# Altium footprint library 2.10-LQFP封装.PcbLib: 109 footprints (part 5 of 8)
Each footprint in its own frame and in the unit in brackets; x right, y up, seen from the top. Pads: shape width x height; smd on the part's side, far side on the other; paste and mask are expansions set on the pad; w line width, h text height; cw(c..) or ccw(c..) is an arc to the next point about the centre after c.
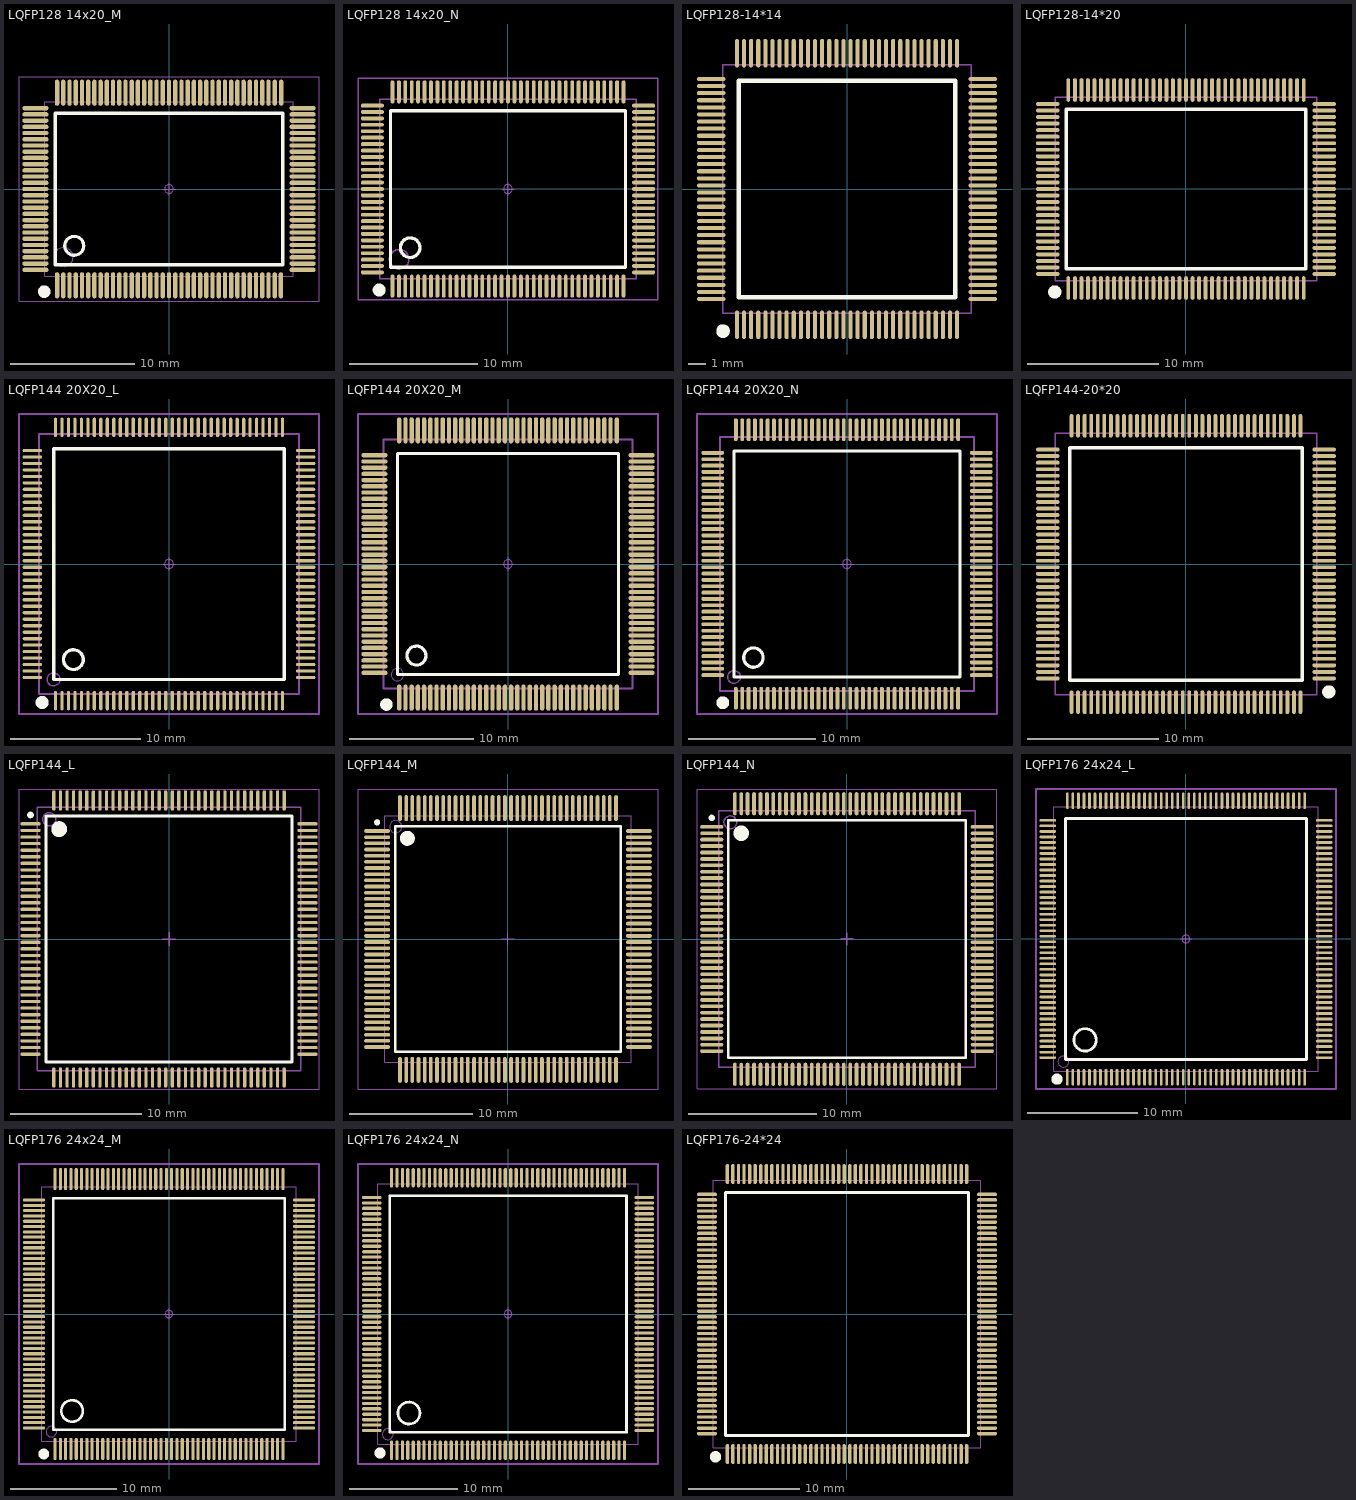
[diagram p4: the footprints below, top view; thin cyan lines are the x and y axes]

## LQFP128 14x20_M [mm] "128脚，体宽：14x20mm, 脚距：0.5mm      [ PCB学习群514746572 ]"
pads (128):
  oval 0.35x2.1 smd: 1(-9,-7.746) 2(-8.5,-7.746) 3(-8,-7.746) 4(-7.5,-7.746) 5(-7,-7.746) 6(-6.5,-7.746) 7(-6,-7.746) 8(-5.5,-7.746) 9(-5,-7.746) 10(-4.5,-7.746) 11(-4,-7.746) 12(-3.5,-7.746) 13(-3,-7.746) 14(-2.5,-7.746) 15(-2,-7.746) 16(-1.5,-7.746) 17(-1,-7.746) 18(-0.5,-7.746) 19(0,-7.746) 20(0.5,-7.746) 21(1,-7.746) 22(1.5,-7.746) 23(2,-7.746) 24(2.5,-7.746) 25(3,-7.746) 26(3.5,-7.746) 27(4,-7.746) 28(4.5,-7.746) 29(5,-7.746) 30(5.5,-7.746) 31(6,-7.746) 32(6.5,-7.746) 33(7,-7.746) 34(7.5,-7.746) 35(8,-7.746) 36(8.5,-7.746) 37(9,-7.746) 65(9.025,7.746) 66(8.5,7.746) 67(8,7.746) 68(7.5,7.746) 69(7,7.746) 70(6.5,7.746) 71(6,7.746) 72(5.5,7.746) 73(5,7.746) 74(4.5,7.746) 75(4,7.746) 76(3.5,7.746) 77(3,7.746) 78(2.5,7.746) 79(2,7.746) 80(1.5,7.746) 81(1,7.746) 82(0.5,7.746) 83(0,7.746) 84(-0.5,7.746) 85(-1,7.746) 86(-1.5,7.746) 87(-2,7.746) 88(-2.5,7.746) 89(-3,7.746) 90(-3.5,7.746) 91(-4,7.746) 92(-4.5,7.746) 93(-5,7.746) 94(-5.5,7.746) 95(-6,7.746) 96(-6.5,7.746) 97(-7,7.746) 98(-7.5,7.746) 99(-8,7.746) 100(-8.5,7.746) 101(-9,7.746)
  oval 2.1x0.35 smd: 38(10.746,-6.5) 39(10.746,-6) 40(10.746,-5.5) 41(10.746,-5) 42(10.746,-4.5) 43(10.746,-4) 44(10.746,-3.5) 45(10.746,-3) 46(10.746,-2.5) 47(10.746,-2) 48(10.746,-1.5) 49(10.746,-1) 50(10.746,-0.5) 51(10.746,0) 52(10.746,0.5) 53(10.746,1) 54(10.746,1.5) 55(10.746,2) 56(10.746,2.5) 57(10.746,3) 58(10.746,3.5) 59(10.746,4) 60(10.746,4.5) 61(10.746,5) 62(10.746,5.5) 63(10.746,6) 64(10.746,6.5) 102(-10.746,6.5) 103(-10.746,6) 104(-10.746,5.5) 105(-10.746,5) 106(-10.746,4.5) 107(-10.746,4) 108(-10.746,3.5) 109(-10.746,3) 110(-10.746,2.5) 111(-10.746,2) 112(-10.746,1.5) 113(-10.746,1) 114(-10.746,0.5) 115(-10.746,0) 116(-10.746,-0.5) 117(-10.746,-1) 118(-10.746,-1.5) 119(-10.746,-2) 120(-10.746,-2.5) 121(-10.746,-3) 122(-10.746,-3.5) 123(-10.746,-4) 124(-10.746,-4.5) 125(-10.746,-5) 126(-10.746,-5.5) 127(-10.746,-6) 128(-10.746,-6.5)
Top Overlay:
  circle w0.508: c-10.033,-8.255 r0.25
  circle w0.254: c-7.62,-4.572 r0.762
  lines w0.254: -9.144,-6.096 9.144,-6.096 9.144,6.096 -9.144,6.096 -9.144,-6.096
Mechanical 13:
  circle w0.1: c-8.476,-5.476 r0.762
  lines w0.1: -10,-7 -10,7 10,7 10,-7 -10,-7
Mechanical 15:
  circle w0.05: c0,0 r0.35
  lines w0.05: -0.5,0 0.5,0 ; 0,-0.5 0,0.5
  lines w0.1: -12.065,-9.017 12.065,-9.017 12.065,9.017 -12.065,9.017 -12.065,-9.017
3D body "LQFP128-14x20.STEP": height 1.45, standoff 0, extent -11.003,-8.003 11.003,8.003

## LQFP128 14x20_N [mm] "128脚，体宽：14x20mm, 脚距：0.5mm     [ PCB学习群514746572 ]"
pads (128):
  oval 0.3x1.8 smd: 1(-8.998,-7.571) 2(-8.498,-7.571) 3(-7.998,-7.571) 4(-7.498,-7.571) 5(-6.998,-7.571) 6(-6.498,-7.571) 7(-5.998,-7.571) 8(-5.498,-7.571) 9(-4.998,-7.571) 10(-4.498,-7.571) 11(-3.998,-7.571) 12(-3.498,-7.571) 13(-2.998,-7.571) 14(-2.498,-7.571) 15(-1.998,-7.571) 16(-1.498,-7.571) 17(-0.998,-7.571) 18(-0.498,-7.571) 19(0.002,-7.571) 20(0.502,-7.571) 21(1.002,-7.571) 22(1.502,-7.571) 23(2.002,-7.571) 24(2.502,-7.571) 25(3.002,-7.571) 26(3.502,-7.571) 27(4.002,-7.571) 28(4.502,-7.571) 29(5.002,-7.571) 30(5.502,-7.571) 31(6.002,-7.571) 32(6.502,-7.571) 33(7.002,-7.571) 34(7.502,-7.571) 35(8.002,-7.571) 36(8.502,-7.571) 37(9.002,-7.571) 65(9.002,7.566) 66(8.502,7.566) 67(8.002,7.566) 68(7.502,7.566) 69(7.002,7.566) 70(6.502,7.566) 71(6.002,7.566) 72(5.502,7.566) 73(5.002,7.566) 74(4.502,7.566) 75(4.002,7.566) 76(3.502,7.566) 77(3.002,7.566) 78(2.502,7.566) 79(2.002,7.566) 80(1.502,7.566) 81(1.002,7.566) 82(0.502,7.566) 83(0.002,7.566) 84(-0.498,7.566) 85(-0.998,7.566) 86(-1.498,7.566) 87(-1.998,7.566) 88(-2.498,7.566) 89(-2.998,7.566) 90(-3.498,7.566) 91(-3.998,7.566) 92(-4.498,7.566) 93(-4.998,7.566) 94(-5.498,7.566) 95(-5.998,7.566) 96(-6.498,7.566) 97(-6.998,7.566) 98(-7.498,7.566) 99(-7.998,7.566) 100(-8.498,7.566) 101(-8.998,7.566)
  oval 1.8x0.3 smd: 38(10.57,-6.502) 39(10.57,-6.002) 40(10.57,-5.502) 41(10.57,-5.002) 42(10.57,-4.502) 43(10.57,-4.002) 44(10.57,-3.502) 45(10.57,-3.002) 46(10.57,-2.502) 47(10.57,-2.002) 48(10.57,-1.502) 49(10.57,-1.002) 50(10.57,-0.502) 51(10.57,-0.002) 52(10.57,0.498) 53(10.57,0.998) 54(10.57,1.498) 55(10.57,1.998) 56(10.57,2.498) 57(10.57,2.998) 58(10.57,3.498) 59(10.57,3.998) 60(10.57,4.498) 61(10.57,4.998) 62(10.57,5.498) 63(10.57,5.998) 64(10.57,6.498) 102(-10.566,6.498) 103(-10.566,5.998) 104(-10.566,5.498) 105(-10.566,4.998) 106(-10.566,4.498) 107(-10.566,3.998) 108(-10.566,3.498) 109(-10.566,2.998) 110(-10.566,2.498) 111(-10.566,1.998) 112(-10.566,1.498) 113(-10.566,0.998) 114(-10.566,0.498) 115(-10.566,-0.002) 116(-10.566,-0.502) 117(-10.566,-1.002) 118(-10.566,-1.502) 119(-10.566,-2.002) 120(-10.566,-2.502) 121(-10.566,-3.002) 122(-10.566,-3.502) 123(-10.566,-4.002) 124(-10.566,-4.502) 125(-10.566,-5.002) 126(-10.566,-5.502) 127(-10.566,-6.002) 128(-10.566,-6.502)
Top Overlay:
  circle w0.508: c-10.033,-7.874 r0.25
  circle w0.254: c-7.618,-4.574 r0.762
  lines w0.254: -9.142,-6.098 9.146,-6.098 9.146,6.094 -9.142,6.094 -9.142,-6.098
Mechanical 13:
  circle w0.1: c-8.474,-5.478 r0.762
  lines w0.1: -9.998,-7.002 -9.998,6.998 10.002,6.998 10.002,-7.002 -9.998,-7.002
Mechanical 15:
  circle w0.05: c0.002,-0.002 r0.35
  lines w0.05: -0.498,-0.002 0.502,-0.002 ; 0.002,-0.502 0.002,0.498
  lines w0.1: -11.682,-8.638 11.686,-8.638 11.686,8.634 -11.682,8.634 -11.682,-8.638
3D body "LQFP128-14x20.STEP": height 1.45, standoff 0, extent -11.003,-8.003 11.003,8.003

## LQFP128-14*14 [mm] "14x14mm, 0.4mm      [ PCBѧϰȺ514746572 ]"
pads (128):
  oval 0.23x1.6 smd: 1(-6.2,-7.648) 2(-5.8,-7.648) 3(-5.4,-7.648) 4(-5,-7.648) 5(-4.6,-7.648) 6(-4.2,-7.648) 7(-3.8,-7.648) 8(-3.4,-7.648) 9(-3,-7.648) 10(-2.6,-7.648) 11(-2.2,-7.648) 12(-1.8,-7.648) 13(-1.4,-7.648) 14(-1,-7.648) 15(-0.6,-7.648) 16(-0.2,-7.648) 17(0.2,-7.648) 18(0.6,-7.648) 19(1,-7.648) 20(1.4,-7.648) 21(1.8,-7.648) 22(2.2,-7.648) 23(2.6,-7.648) 24(3,-7.648) 25(3.4,-7.648) 26(3.8,-7.648) 27(4.2,-7.648) 28(4.6,-7.648) 29(5,-7.648) 30(5.4,-7.648) 31(5.8,-7.648) 32(6.2,-7.648) 65(6.2,7.653) 66(5.8,7.653) 67(5.4,7.653) 68(5,7.653) 69(4.6,7.653) 70(4.2,7.653) 71(3.8,7.653) 72(3.4,7.653) 73(3,7.653) 74(2.6,7.653) 75(2.2,7.653) 76(1.8,7.653) 77(1.4,7.653) 78(1,7.653) 79(0.6,7.653) 80(0.2,7.653) 81(-0.2,7.653) 82(-0.6,7.653) 83(-1,7.653) 84(-1.4,7.653) 85(-1.8,7.653) 86(-2.2,7.653) 87(-2.6,7.653) 88(-3,7.653) 89(-3.4,7.653) 90(-3.8,7.653) 91(-4.2,7.653) 92(-4.6,7.653) 93(-5,7.653) 94(-5.4,7.653) 95(-5.8,7.653) 96(-6.2,7.653)
  oval 1.6x0.23 smd: 33(7.651,-6.198) 34(7.651,-5.798) 35(7.651,-5.398) 36(7.651,-4.998) 37(7.651,-4.598) 38(7.651,-4.198) 39(7.651,-3.798) 40(7.651,-3.398) 41(7.651,-2.998) 42(7.651,-2.598) 43(7.651,-2.198) 44(7.651,-1.798) 45(7.651,-1.398) 46(7.651,-0.998) 47(7.651,-0.598) 48(7.651,-0.198) 49(7.651,0.202) 50(7.651,0.602) 51(7.651,1.002) 52(7.651,1.402) 53(7.651,1.802) 54(7.651,2.202) 55(7.651,2.602) 56(7.651,3.002) 57(7.651,3.402) 58(7.651,3.802) 59(7.651,4.202) 60(7.651,4.602) 61(7.651,5.002) 62(7.651,5.402) 63(7.651,5.802) 64(7.651,6.202) 97(-7.651,6.202) 98(-7.651,5.802) 99(-7.651,5.402) 100(-7.651,5.002) 101(-7.651,4.602) 102(-7.651,4.202) 103(-7.651,3.802) 104(-7.651,3.402) 105(-7.651,3.002) 106(-7.651,2.602) 107(-7.651,2.202) 108(-7.651,1.802) 109(-7.651,1.402) 110(-7.651,1.002) 111(-7.651,0.602) 112(-7.651,0.202) 113(-7.651,-0.198) 114(-7.651,-0.598) 115(-7.651,-0.998) 116(-7.651,-1.398) 117(-7.651,-1.798) 118(-7.651,-2.198) 119(-7.651,-2.598) 120(-7.651,-2.998) 121(-7.651,-3.398) 122(-7.651,-3.798) 123(-7.651,-4.198) 124(-7.651,-4.598) 125(-7.651,-4.998) 126(-7.651,-5.398) 127(-7.651,-5.798) 128(-7.651,-6.198)
Top Overlay:
  circle w0.508: c-6.985,-8.001 r0.127
  lines w0.254: -6.096,-6.094 6.096,-6.094 6.096,6.098 -6.096,6.098 -6.096,-6.094
Mechanical 13:
  lines w0.1: -7,-6.998 -7,7.002 7,7.002 7,-6.998 -7,-6.998
3D body "LQFP128-14x14.STEP": height 1.45, standoff 0, extent -8.003,-8.003 8.003,8.003

## LQFP128-14*20 [mm] "14x20mm, 0.5mm      [ PCBѧϰȺ514746572 ]"
pads (128):
  oval 0.3x1.8 smd: 1(-8.998,-7.571) 2(-8.498,-7.571) 3(-7.998,-7.571) 4(-7.498,-7.571) 5(-6.998,-7.571) 6(-6.498,-7.571) 7(-5.998,-7.571) 8(-5.498,-7.571) 9(-4.998,-7.571) 10(-4.498,-7.571) 11(-3.998,-7.571) 12(-3.498,-7.571) 13(-2.998,-7.571) 14(-2.498,-7.571) 15(-1.998,-7.571) 16(-1.498,-7.571) 17(-0.998,-7.571) 18(-0.498,-7.571) 19(0.002,-7.571) 20(0.502,-7.571) 21(1.002,-7.571) 22(1.502,-7.571) 23(2.002,-7.571) 24(2.502,-7.571) 25(3.002,-7.571) 26(3.502,-7.571) 27(4.002,-7.571) 28(4.502,-7.571) 29(5.002,-7.571) 30(5.502,-7.571) 31(6.002,-7.571) 32(6.502,-7.571) 33(7.002,-7.571) 34(7.502,-7.571) 35(8.002,-7.571) 36(8.502,-7.571) 37(9.002,-7.571) 65(9.002,7.566) 66(8.502,7.566) 67(8.002,7.566) 68(7.502,7.566) 69(7.002,7.566) 70(6.502,7.566) 71(6.002,7.566) 72(5.502,7.566) 73(5.002,7.566) 74(4.502,7.566) 75(4.002,7.566) 76(3.502,7.566) 77(3.002,7.566) 78(2.502,7.566) 79(2.002,7.566) 80(1.502,7.566) 81(1.002,7.566) 82(0.502,7.566) 83(0.002,7.566) 84(-0.498,7.566) 85(-0.998,7.566) 86(-1.498,7.566) 87(-1.998,7.566) 88(-2.498,7.566) 89(-2.998,7.566) 90(-3.498,7.566) 91(-3.998,7.566) 92(-4.498,7.566) 93(-4.998,7.566) 94(-5.498,7.566) 95(-5.998,7.566) 96(-6.498,7.566) 97(-6.998,7.566) 98(-7.498,7.566) 99(-7.998,7.566) 100(-8.498,7.566) 101(-8.998,7.566)
  oval 1.8x0.3 smd: 38(10.57,-6.502) 39(10.57,-6.002) 40(10.57,-5.502) 41(10.57,-5.002) 42(10.57,-4.502) 43(10.57,-4.002) 44(10.57,-3.502) 45(10.57,-3.002) 46(10.57,-2.502) 47(10.57,-2.002) 48(10.57,-1.502) 49(10.57,-1.002) 50(10.57,-0.502) 51(10.57,-0.002) 52(10.57,0.498) 53(10.57,0.998) 54(10.57,1.498) 55(10.57,1.998) 56(10.57,2.498) 57(10.57,2.998) 58(10.57,3.498) 59(10.57,3.998) 60(10.57,4.498) 61(10.57,4.998) 62(10.57,5.498) 63(10.57,5.998) 64(10.57,6.498) 102(-10.566,6.498) 103(-10.566,5.998) 104(-10.566,5.498) 105(-10.566,4.998) 106(-10.566,4.498) 107(-10.566,3.998) 108(-10.566,3.498) 109(-10.566,2.998) 110(-10.566,2.498) 111(-10.566,1.998) 112(-10.566,1.498) 113(-10.566,0.998) 114(-10.566,0.498) 115(-10.566,-0.002) 116(-10.566,-0.502) 117(-10.566,-1.002) 118(-10.566,-1.502) 119(-10.566,-2.002) 120(-10.566,-2.502) 121(-10.566,-3.002) 122(-10.566,-3.502) 123(-10.566,-4.002) 124(-10.566,-4.502) 125(-10.566,-5.002) 126(-10.566,-5.502) 127(-10.566,-6.002) 128(-10.566,-6.502)
Top Overlay:
  circle w0.508: c-10.033,-7.874 r0.25
  lines w0.254: -9.142,-6.098 -9.142,6.094 9.146,6.094 9.146,-6.098 -9.142,-6.098
Mechanical 13:
  lines w0.1: -9.998,-7.002 10.002,-7.002 10.002,6.998 -9.998,6.998 -9.998,-7.002
3D body "LQFP128-14x20.STEP": height 1.45, standoff 0, extent -11.003,-8.003 11.003,8.003

## LQFP144 20X20_L [mm] "144脚，体宽20x20mm，脚距0.5mm      [ PCB学习群514746572 ]"
pads (144):
  oval 0.25x1.5 smd: 1(-8.75,-10.525) 2(-8.25,-10.525) 3(-7.75,-10.525) 4(-7.25,-10.525) 5(-6.75,-10.525) 6(-6.25,-10.525) 7(-5.75,-10.525) 8(-5.25,-10.525) 9(-4.75,-10.525) 10(-4.25,-10.525) 11(-3.75,-10.525) 12(-3.25,-10.525) 13(-2.75,-10.525) 14(-2.25,-10.525) 15(-1.75,-10.525) 16(-1.25,-10.525) 17(-0.75,-10.525) 18(-0.25,-10.525) 19(0.25,-10.525) 20(0.75,-10.525) 21(1.25,-10.525) 22(1.75,-10.525) 23(2.25,-10.525) 24(2.75,-10.525) 25(3.25,-10.525) 26(3.75,-10.525) 27(4.25,-10.525) 28(4.75,-10.525) 29(5.25,-10.525) 30(5.75,-10.525) 31(6.25,-10.525) 32(6.75,-10.525) 33(7.25,-10.525) 34(7.75,-10.525) 35(8.25,-10.525) 36(8.75,-10.525) 73(8.75,10.525) 74(8.25,10.525) 75(7.75,10.525) 76(7.25,10.525) 77(6.75,10.525) 78(6.25,10.525) 79(5.75,10.525) 80(5.25,10.525) 81(4.75,10.525) 82(4.25,10.525) 83(3.75,10.525) 84(3.25,10.525) 85(2.75,10.525) 86(2.25,10.525) 87(1.75,10.525) 88(1.25,10.525) 89(0.75,10.525) 90(0.25,10.525) 91(-0.25,10.525) 92(-0.75,10.525) 93(-1.25,10.525) 94(-1.75,10.525) 95(-2.25,10.525) 96(-2.75,10.525) 97(-3.25,10.525) 98(-3.75,10.525) 99(-4.25,10.525) 100(-4.75,10.525) 101(-5.25,10.525) 102(-5.75,10.525) 103(-6.25,10.525) 104(-6.75,10.525) 105(-7.25,10.525) 106(-7.75,10.525) 107(-8.25,10.525) 108(-8.75,10.525)
  oval 1.5x0.25 smd: 37(10.525,-8.75) 38(10.525,-8.25) 39(10.525,-7.75) 40(10.525,-7.25) 41(10.525,-6.75) 42(10.525,-6.25) 43(10.525,-5.75) 44(10.525,-5.25) 45(10.525,-4.75) 46(10.525,-4.25) 47(10.525,-3.75) 48(10.525,-3.25) 49(10.525,-2.75) 50(10.525,-2.25) 51(10.525,-1.75) 52(10.525,-1.25) 53(10.525,-0.75) 54(10.525,-0.25) 55(10.525,0.25) 56(10.525,0.75) 57(10.525,1.25) 58(10.525,1.75) 59(10.525,2.25) 60(10.525,2.75) 61(10.525,3.25) 62(10.525,3.75) 63(10.525,4.25) 64(10.525,4.75) 65(10.525,5.25) 66(10.525,5.75) 67(10.525,6.25) 68(10.525,6.75) 69(10.525,7.25) 70(10.525,7.75) 71(10.525,8.25) 72(10.525,8.75) 109(-10.525,8.75) 110(-10.525,8.25) 111(-10.525,7.75) 112(-10.525,7.25) 113(-10.525,6.75) 114(-10.525,6.25) 115(-10.525,5.75) 116(-10.525,5.25) 117(-10.525,4.75) 118(-10.525,4.25) 119(-10.525,3.75) 120(-10.525,3.25) 121(-10.525,2.75) 122(-10.525,2.25) 123(-10.525,1.75) 124(-10.525,1.25) 125(-10.525,0.75) 126(-10.525,0.25) 127(-10.525,-0.25) 128(-10.525,-0.75) 129(-10.525,-1.25) 130(-10.525,-1.75) 131(-10.525,-2.25) 132(-10.525,-2.75) 133(-10.525,-3.25) 134(-10.525,-3.75) 135(-10.525,-4.25) 136(-10.525,-4.75) 137(-10.525,-5.25) 138(-10.525,-5.75) 139(-10.525,-6.25) 140(-10.525,-6.75) 141(-10.525,-7.25) 142(-10.525,-7.75) 143(-10.525,-8.25) 144(-10.525,-8.75)
Top Overlay:
  circle w0.508: c-9.779,-10.668 r0.25
  circle w0.254: c-7.366,-7.366 r0.762
  lines w0.254: -8.89,-8.892 -8.89,8.89 8.89,8.89 8.89,-8.892 -8.89,-8.892
Mechanical 13:
  circle w0.1: c-8.894,-8.894 r0.5
  lines w0.15: -10,-10 10,-10 10,10 -10,10 -10,-10
Mechanical 15:
  circle w0.05: c0,0 r0.35
  lines w0.05: -0.5,0 0.5,0 ; 0,-0.5 0,0.5
  lines w0.15: -11.557,-11.557 -11.557,11.557 11.557,11.557 11.557,-11.557 -11.557,-11.557
3D body "LQFP144-20x20.STEP": height 1.45, standoff 0, extent -11.003,-11.003 11.003,11.003

## LQFP144 20X20_M [mm] "144脚，体宽20x20mm，脚距0.5mm      [ PCB学习群514746572 ]"
pads (144):
  oval 0.35x2.1 smd: 1(-8.75,-10.747) 2(-8.25,-10.747) 3(-7.75,-10.747) 4(-7.25,-10.747) 5(-6.75,-10.747) 6(-6.25,-10.747) 7(-5.75,-10.747) 8(-5.25,-10.747) 9(-4.75,-10.747) 10(-4.25,-10.747) 11(-3.75,-10.747) 12(-3.25,-10.747) 13(-2.75,-10.747) 14(-2.25,-10.747) 15(-1.75,-10.747) 16(-1.25,-10.747) 17(-0.75,-10.747) 18(-0.25,-10.747) 19(0.25,-10.747) 20(0.75,-10.747) 21(1.25,-10.747) 22(1.75,-10.747) 23(2.25,-10.747) 24(2.75,-10.747) 25(3.25,-10.747) 26(3.75,-10.747) 27(4.25,-10.747) 28(4.75,-10.747) 29(5.25,-10.747) 30(5.75,-10.747) 31(6.25,-10.747) 32(6.75,-10.747) 33(7.25,-10.747) 34(7.75,-10.747) 35(8.25,-10.747) 36(8.75,-10.747) 73(8.75,10.747) 74(8.25,10.747) 75(7.75,10.747) 76(7.25,10.747) 77(6.75,10.747) 78(6.25,10.747) 79(5.75,10.747) 80(5.25,10.747) 81(4.75,10.747) 82(4.25,10.747) 83(3.75,10.747) 84(3.25,10.747) 85(2.75,10.747) 86(2.25,10.747) 87(1.75,10.747) 88(1.25,10.747) 89(0.75,10.747) 90(0.25,10.747) 91(-0.25,10.747) 92(-0.75,10.747) 93(-1.25,10.747) 94(-1.75,10.747) 95(-2.25,10.747) 96(-2.75,10.747) 97(-3.25,10.747) 98(-3.75,10.747) 99(-4.25,10.747) 100(-4.75,10.747) 101(-5.25,10.747) 102(-5.75,10.747) 103(-6.25,10.747) 104(-6.75,10.747) 105(-7.25,10.747) 106(-7.75,10.747) 107(-8.25,10.747) 108(-8.75,10.747)
  oval 2.1x0.35 smd: 37(10.747,-8.75) 38(10.747,-8.25) 39(10.747,-7.75) 40(10.747,-7.25) 41(10.747,-6.75) 42(10.747,-6.25) 43(10.747,-5.75) 44(10.747,-5.25) 45(10.747,-4.75) 46(10.747,-4.25) 47(10.747,-3.75) 48(10.747,-3.25) 49(10.747,-2.75) 50(10.747,-2.25) 51(10.747,-1.75) 52(10.747,-1.25) 53(10.747,-0.75) 54(10.747,-0.25) 55(10.747,0.25) 56(10.747,0.75) 57(10.747,1.25) 58(10.747,1.75) 59(10.747,2.25) 60(10.747,2.75) 61(10.747,3.25) 62(10.747,3.75) 63(10.747,4.25) 64(10.747,4.75) 65(10.747,5.25) 66(10.747,5.75) 67(10.747,6.25) 68(10.747,6.75) 69(10.747,7.25) 70(10.747,7.75) 71(10.747,8.25) 72(10.747,8.75) 109(-10.747,8.75) 110(-10.747,8.25) 111(-10.747,7.75) 112(-10.747,7.25) 113(-10.747,6.75) 114(-10.747,6.25) 115(-10.747,5.75) 116(-10.747,5.25) 117(-10.747,4.75) 118(-10.747,4.25) 119(-10.747,3.75) 120(-10.747,3.25) 121(-10.747,2.75) 122(-10.747,2.25) 123(-10.747,1.75) 124(-10.747,1.25) 125(-10.747,0.75) 126(-10.747,0.25) 127(-10.747,-0.25) 128(-10.747,-0.75) 129(-10.747,-1.25) 130(-10.747,-1.75) 131(-10.747,-2.25) 132(-10.747,-2.75) 133(-10.747,-3.25) 134(-10.747,-3.75) 135(-10.747,-4.25) 136(-10.747,-4.75) 137(-10.747,-5.25) 138(-10.747,-5.75) 139(-10.747,-6.25) 140(-10.747,-6.75) 141(-10.747,-7.25) 142(-10.747,-7.75) 143(-10.747,-8.25) 144(-10.747,-8.75)
Top Overlay:
  circle w0.254: c-7.366,-7.366 r0.762
  circle w0.508: c-9.779,-11.303 r0.25
  lines w0.254: -8.89,-8.892 -8.89,8.89 8.89,8.89 8.89,-8.892 -8.89,-8.892
Mechanical 13:
  circle w0.1: c-8.894,-8.894 r0.5
  lines w0.15: -10,-10 10,-10 10,10 -10,10 -10,-10
Mechanical 15:
  circle w0.05: c0,0 r0.35
  lines w0.05: -0.5,0 0.5,0 ; 0,-0.5 0,0.5
  lines w0.15: -12.065,-12.065 -12.065,12.065 12.065,12.065 12.065,-12.065 -12.065,-12.065
3D body "LQFP144-20x20.STEP": height 1.45, standoff 0, extent -11.003,-11.003 11.003,11.003

## LQFP144 20X20_N [mm] "144脚，体宽20x20mm，脚距0.5mm     [ PCB学习群514746572 ]"
pads (144):
  oval 0.3x1.8 smd: 1(-8.75,-10.573) 2(-8.25,-10.573) 3(-7.75,-10.573) 4(-7.25,-10.573) 5(-6.75,-10.573) 6(-6.25,-10.573) 7(-5.75,-10.573) 8(-5.25,-10.573) 9(-4.75,-10.573) 10(-4.25,-10.573) 11(-3.75,-10.573) 12(-3.25,-10.573) 13(-2.75,-10.573) 14(-2.25,-10.573) 15(-1.75,-10.573) 16(-1.25,-10.573) 17(-0.75,-10.573) 18(-0.25,-10.573) 19(0.25,-10.573) 20(0.75,-10.573) 21(1.25,-10.573) 22(1.75,-10.573) 23(2.25,-10.573) 24(2.75,-10.573) 25(3.25,-10.573) 26(3.75,-10.573) 27(4.25,-10.573) 28(4.75,-10.573) 29(5.25,-10.573) 30(5.75,-10.573) 31(6.25,-10.573) 32(6.75,-10.573) 33(7.25,-10.573) 34(7.75,-10.573) 35(8.25,-10.573) 36(8.75,-10.573) 73(8.75,10.573) 74(8.25,10.573) 75(7.75,10.573) 76(7.25,10.573) 77(6.75,10.573) 78(6.25,10.573) 79(5.75,10.573) 80(5.25,10.573) 81(4.75,10.573) 82(4.25,10.573) 83(3.75,10.573) 84(3.25,10.573) 85(2.75,10.573) 86(2.25,10.573) 87(1.75,10.573) 88(1.25,10.573) 89(0.75,10.573) 90(0.25,10.573) 91(-0.25,10.573) 92(-0.75,10.573) 93(-1.25,10.573) 94(-1.75,10.573) 95(-2.25,10.573) 96(-2.75,10.573) 97(-3.25,10.573) 98(-3.75,10.573) 99(-4.25,10.573) 100(-4.75,10.573) 101(-5.25,10.573) 102(-5.75,10.573) 103(-6.25,10.573) 104(-6.75,10.573) 105(-7.25,10.573) 106(-7.75,10.573) 107(-8.25,10.573) 108(-8.75,10.573)
  oval 1.8x0.3 smd: 37(10.573,-8.75) 38(10.573,-8.25) 39(10.573,-7.75) 40(10.573,-7.25) 41(10.573,-6.75) 42(10.573,-6.25) 43(10.573,-5.75) 44(10.573,-5.25) 45(10.573,-4.75) 46(10.573,-4.25) 47(10.573,-3.75) 48(10.573,-3.25) 49(10.573,-2.75) 50(10.573,-2.25) 51(10.573,-1.75) 52(10.573,-1.25) 53(10.573,-0.75) 54(10.573,-0.25) 55(10.573,0.25) 56(10.573,0.75) 57(10.573,1.25) 58(10.573,1.75) 59(10.573,2.25) 60(10.573,2.75) 61(10.573,3.25) 62(10.573,3.75) 63(10.573,4.25) 64(10.573,4.75) 65(10.573,5.25) 66(10.573,5.75) 67(10.573,6.25) 68(10.573,6.75) 69(10.573,7.25) 70(10.573,7.75) 71(10.573,8.25) 72(10.573,8.75) 109(-10.573,8.75) 110(-10.573,8.25) 111(-10.573,7.75) 112(-10.573,7.25) 113(-10.573,6.75) 114(-10.573,6.25) 115(-10.573,5.75) 116(-10.573,5.25) 117(-10.573,4.75) 118(-10.573,4.25) 119(-10.573,3.75) 120(-10.573,3.25) 121(-10.573,2.75) 122(-10.573,2.25) 123(-10.573,1.75) 124(-10.573,1.25) 125(-10.573,0.75) 126(-10.573,0.25) 127(-10.573,-0.25) 128(-10.573,-0.75) 129(-10.573,-1.25) 130(-10.573,-1.75) 131(-10.573,-2.25) 132(-10.573,-2.75) 133(-10.573,-3.25) 134(-10.573,-3.75) 135(-10.573,-4.25) 136(-10.573,-4.75) 137(-10.573,-5.25) 138(-10.573,-5.75) 139(-10.573,-6.25) 140(-10.573,-6.75) 141(-10.573,-7.25) 142(-10.573,-7.75) 143(-10.573,-8.25) 144(-10.573,-8.75)
Top Overlay:
  circle w0.508: c-9.779,-10.922 r0.25
  circle w0.254: c-7.366,-7.366 r0.762
  lines w0.254: -8.89,-8.892 -8.89,8.89 8.89,8.89 8.89,-8.892 -8.89,-8.892
Mechanical 13:
  circle w0.1: c-8.894,-8.894 r0.5
  lines w0.15: -10,-10 10,-10 10,10 -10,10 -10,-10
Mechanical 15:
  circle w0.05: c0,0 r0.35
  lines w0.05: -0.5,0 0.5,0 ; 0,-0.5 0,0.5
  lines w0.15: -11.811,-11.811 -11.811,11.811 11.811,11.811 11.811,-11.811 -11.811,-11.811
3D body "LQFP144-20x20.STEP": height 1.45, standoff 0, extent -11.003,-11.003 11.003,11.003
